# Altium footprint library AOO.PcbLib: 131 footprints (part 4 of 9)
Each footprint in its own frame and in the unit in brackets; x right, y up, seen from the top. Pads: shape width x height; smd on the part's side, far side on the other; paste and mask are expansions set on the pad; w line width, h text height; cw(c..) or ccw(c..) is an arc to the next point about the centre after c.
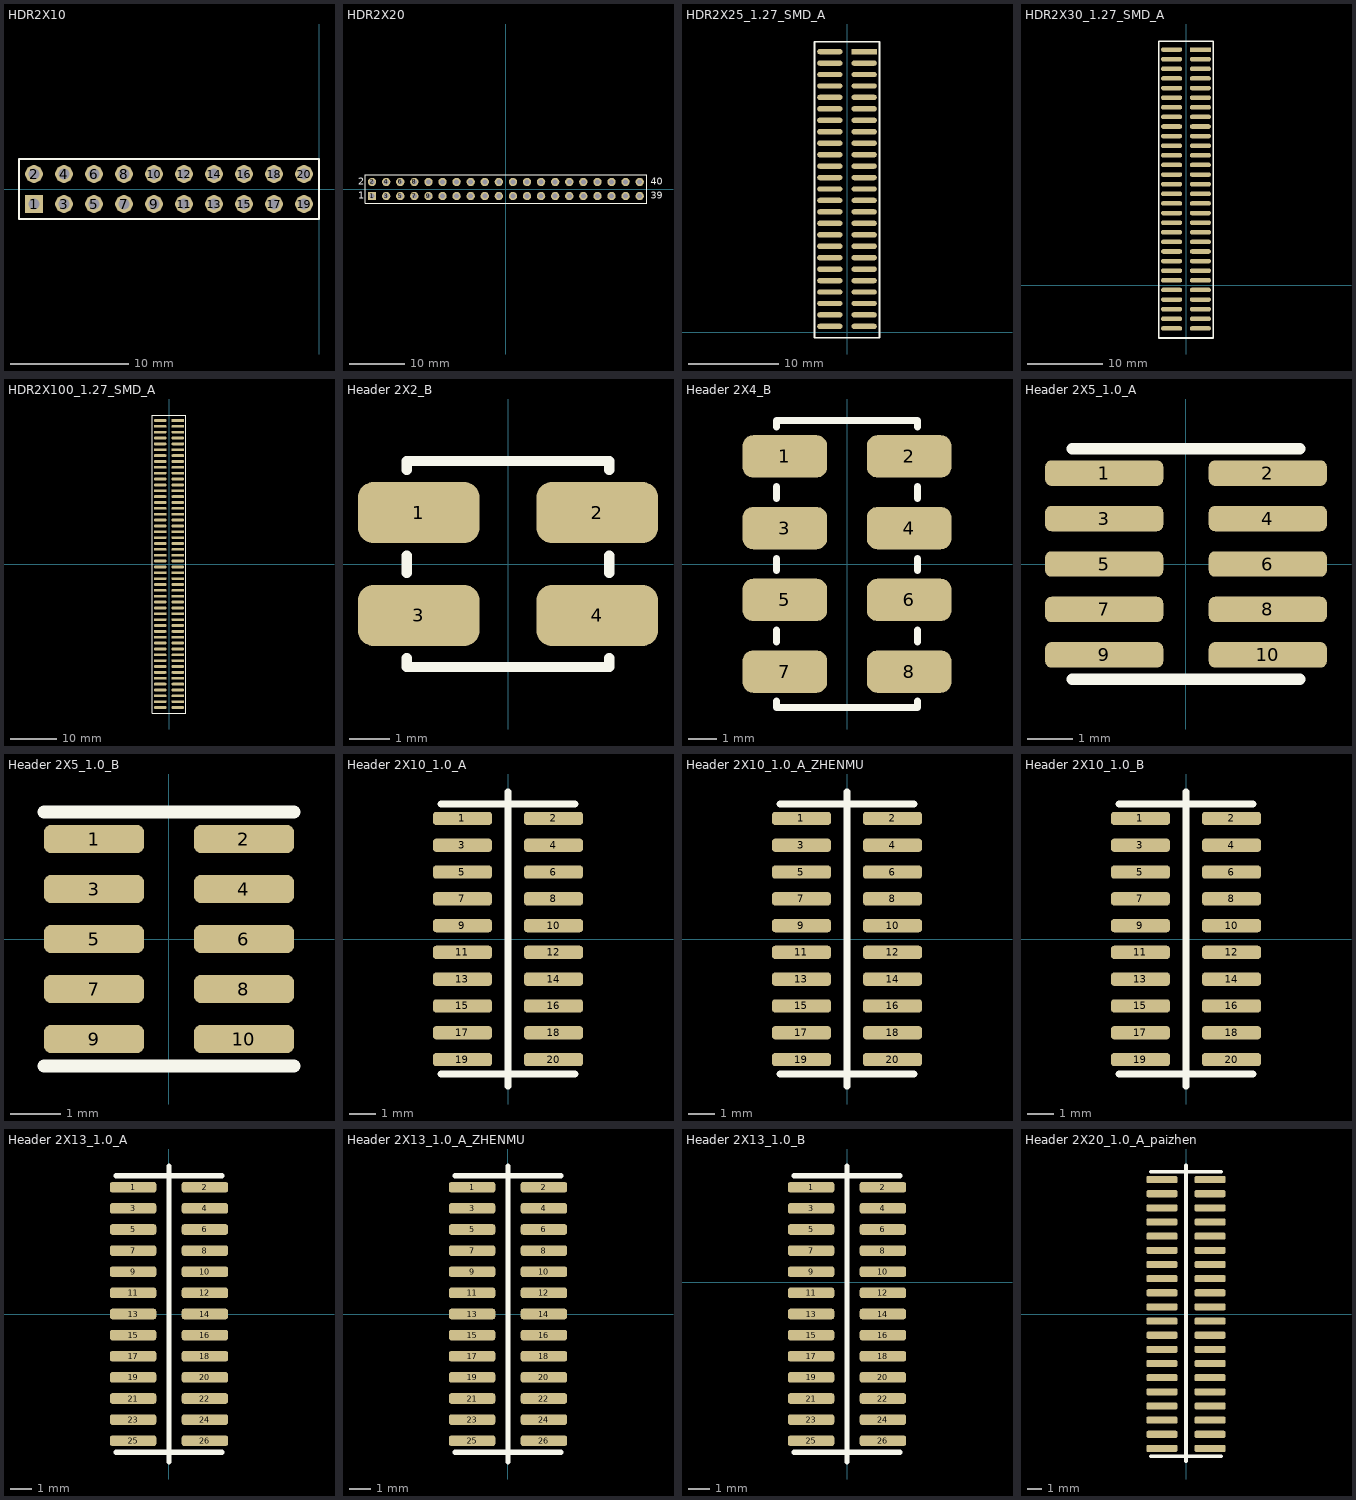
[diagram p3: the footprints below, top view; thin cyan lines are the x and y axes]

## HDR2X10 [mm] "HDR2X10"
pads (20):
  rect 1.5x1.5 hole 0.9: 1(-24.13,-1.27)
  round 1.5 hole 0.9: 2(-24.13,1.27) 3(-21.59,-1.27) 4(-21.59,1.27) 5(-19.05,-1.27) 6(-19.05,1.27) 7(-16.51,-1.27) 8(-16.51,1.27) 9(-13.97,-1.27) 10(-13.97,1.27) 11(-11.43,-1.27) 12(-11.43,1.27) 13(-8.89,-1.27) 14(-8.89,1.27) 15(-6.35,-1.27) 16(-6.35,1.27) 17(-3.81,-1.27) 18(-3.81,1.27) 19(-1.27,-1.27) 20(-1.27,1.27)
Top Overlay:
  lines w0.2: -25.4,-2.54 0,-2.54 0,2.54 -25.4,2.54 -25.4,-2.54

## HDR2X20 [mm] "Connector; Header; 20x2 Position"
pads (40):
  rect 1.5x1.5 hole 0.9: 1(-24.13,-1.27)
  round 1.5 hole 0.9: 2(-24.13,1.27) 3(-21.59,-1.27) 4(-21.59,1.27) 5(-19.05,-1.27) 6(-19.05,1.27) 7(-16.51,-1.27) 8(-16.51,1.27) 9(-13.97,-1.27) 10(-13.97,1.27) 11(-11.43,-1.27) 12(-11.43,1.27) 13(-8.89,-1.27) 14(-8.89,1.27) 15(-6.35,-1.27) 16(-6.35,1.27) 17(-3.81,-1.27) 18(-3.81,1.27) 19(-1.27,-1.27) 20(-1.27,1.27) 21(1.27,-1.27) 22(1.27,1.27) 23(3.81,-1.27) 24(3.81,1.27) 25(6.35,-1.27) 26(6.35,1.27) 27(8.89,-1.27) 28(8.89,1.27) 29(11.43,-1.27) 30(11.43,1.27) 31(13.97,-1.27) 32(13.97,1.27) 33(16.51,-1.27) 34(16.51,1.27) 35(19.05,-1.27) 36(19.05,1.27) 37(21.59,-1.27) 38(21.59,1.27) 39(24.13,-1.27) 40(24.13,1.27)
Top Overlay:
  lines w0.2: -25.4,-2.54 25.4,-2.54 25.4,2.54 -25.4,2.54 -25.4,-2.54
  text "1" at -26.67,-1.778 h1.27
  text "2" at -26.67,0.762 h1.27
  text "40" at 26.162,0.762 h1.27
  text "39" at 26.162,-1.778 h1.27

## HDR2X25_1.27_SMD_A [mm] "Connector; Header; 20x2 Position"
pads (50):
  rect 2.8x0.6 smd: 1(1.905,31.115)
  oval 2.8x0.6 smd: 2(-1.905,31.115) 3(1.905,29.845) 4(-1.905,29.845) 5(1.905,28.575) 6(-1.905,28.575) 7(1.905,27.305) 8(-1.905,27.305) 9(1.905,26.035) 10(-1.905,26.035) 11(1.905,24.765) 12(-1.905,24.765) 13(1.905,23.495) 14(-1.905,23.495) 15(1.905,22.225) 16(-1.905,22.225) 17(1.905,20.955) 18(-1.905,20.955) 19(1.905,19.685) 20(-1.905,19.685) 21(1.905,18.415) 22(-1.905,18.415) 23(1.905,17.145) 24(-1.905,17.145) 25(1.905,15.875) 26(-1.905,15.875) 27(1.905,14.605) 28(-1.905,14.605) 29(1.905,13.335) 30(-1.905,13.335) 31(1.905,12.065) 32(-1.905,12.065) 33(1.905,10.795) 34(-1.905,10.795) 35(1.905,9.525) 36(-1.905,9.525) 37(1.905,8.255) 38(-1.905,8.255) 39(1.905,6.985) 40(-1.905,6.985) 41(1.905,5.715) 42(-1.905,5.715) 43(1.905,4.445) 44(-1.905,4.445) 45(1.905,3.175) 46(-1.905,3.175) 47(1.905,1.905) 48(-1.905,1.905) 49(1.905,0.635) 50(-1.905,0.635)
Top Overlay:
  lines w0.2: -3.6,-0.635 -3.6,32.207 ; 3.6,-0.635 3.6,32.207
  lines w0.203: -3.6,-0.635 3.6,-0.635 ; -3.6,32.207 3.6,32.207

## HDR2X30_1.27_SMD_A [mm] "Connector; Header; 20x2 Position"
pads (60):
  rect 2.8x0.6 smd: 1(1.905,31.115)
  oval 2.8x0.6 smd: 2(-1.905,31.115) 3(1.905,29.845) 4(-1.905,29.845) 5(1.905,28.575) 6(-1.905,28.575) 7(1.905,27.305) 8(-1.905,27.305) 9(1.905,26.035) 10(-1.905,26.035) 11(1.905,24.765) 12(-1.905,24.765) 13(1.905,23.495) 14(-1.905,23.495) 15(1.905,22.225) 16(-1.905,22.225) 17(1.905,20.955) 18(-1.905,20.955) 19(1.905,19.685) 20(-1.905,19.685) 21(1.905,18.415) 22(-1.905,18.415) 23(1.905,17.145) 24(-1.905,17.145) 25(1.905,15.875) 26(-1.905,15.875) 27(1.905,14.605) 28(-1.905,14.605) 29(1.905,13.335) 30(-1.905,13.335) 31(1.905,12.065) 32(-1.905,12.065) 33(1.905,10.795) 34(-1.905,10.795) 35(1.905,9.525) 36(-1.905,9.525) 37(1.905,8.255) 38(-1.905,8.255) 39(1.905,6.985) 40(-1.905,6.985) 41(1.905,5.715) 42(-1.905,5.715) 43(1.905,4.445) 44(-1.905,4.445) 45(1.905,3.175) 46(-1.905,3.175) 47(1.905,1.905) 48(-1.905,1.905) 49(1.905,0.635) 50(-1.905,0.635) 51(1.905,-0.635) 52(-1.905,-0.635) 53(1.905,-1.905) 54(-1.905,-1.905) 55(1.905,-3.175) 56(-1.905,-3.175) 57(1.905,-4.445) 58(-1.905,-4.445) 59(1.905,-5.715) 60(-1.905,-5.715)
Top Overlay:
  lines w0.2: -3.6,-6.985 -3.6,32.207 ; 3.6,-6.985 3.6,32.207
  lines w0.203: -3.6,-6.985 3.6,-6.985 ; -3.6,32.207 3.6,32.207

## HDR2X100_1.27_SMD_A [mm] "Connector; Header; 20x2 Position"
pads (100):
  rect 2.8x0.6 smd: 1(1.905,31.115)
  oval 2.8x0.6 smd: 2(-1.905,31.115) 3(1.905,29.845) 4(-1.905,29.845) 5(1.905,28.575) 6(-1.905,28.575) 7(1.905,27.305) 8(-1.905,27.305) 9(1.905,26.035) 10(-1.905,26.035) 11(1.905,24.765) 12(-1.905,24.765) 13(1.905,23.495) 14(-1.905,23.495) 15(1.905,22.225) 16(-1.905,22.225) 17(1.905,20.955) 18(-1.905,20.955) 19(1.905,19.685) 20(-1.905,19.685) 21(1.905,18.415) 22(-1.905,18.415) 23(1.905,17.145) 24(-1.905,17.145) 25(1.905,15.875) 26(-1.905,15.875) 27(1.905,14.605) 28(-1.905,14.605) 29(1.905,13.335) 30(-1.905,13.335) 31(1.905,12.065) 32(-1.905,12.065) 33(1.905,10.795) 34(-1.905,10.795) 35(1.905,9.525) 36(-1.905,9.525) 37(1.905,8.255) 38(-1.905,8.255) 39(1.905,6.985) 40(-1.905,6.985) 41(1.905,5.715) 42(-1.905,5.715) 43(1.905,4.445) 44(-1.905,4.445) 45(1.905,3.175) 46(-1.905,3.175) 47(1.905,1.905) 48(-1.905,1.905) 49(1.905,0.635) 50(-1.905,0.635) 51(1.905,-0.635) 52(-1.905,-0.635) 53(1.905,-1.905) 54(-1.905,-1.905) 55(1.905,-3.175) 56(-1.905,-3.175) 57(1.905,-4.445) 58(-1.905,-4.445) 59(1.905,-5.715) 60(-1.905,-5.715) 61(1.905,-6.985) 62(-1.905,-6.985) 63(1.905,-8.255) 64(-1.905,-8.255) 65(1.905,-9.525) 66(-1.905,-9.525) 67(1.905,-10.795) 68(-1.905,-10.795) 69(1.905,-12.065) 70(-1.905,-12.065) 71(1.905,-13.335) 72(-1.905,-13.335) 73(1.905,-14.605) 74(-1.905,-14.605) 75(1.905,-15.875) 76(-1.905,-15.875) 77(1.905,-17.145) 78(-1.905,-17.145) 79(1.905,-18.415) 80(-1.905,-18.415) 81(1.905,-19.685) 82(-1.905,-19.685) 83(1.905,-20.955) 84(-1.905,-20.955) 85(1.905,-22.225) 86(-1.905,-22.225) 87(1.905,-23.495) 88(-1.905,-23.495) 89(1.905,-24.765) 90(-1.905,-24.765) 91(1.905,-26.035) 92(-1.905,-26.035) 93(1.905,-27.305) 94(-1.905,-27.305) 95(1.905,-28.575) 96(-1.905,-28.575) 97(1.905,-29.845) 98(-1.905,-29.845) 99(1.905,-31.115) 100(-1.905,-31.115)
Top Overlay:
  lines w0.2: -3.6,-32.385 -3.6,32.207 ; 3.6,-32.385 3.6,32.207
  lines w0.203: -3.6,-32.385 3.6,-32.385 ; -3.6,32.207 3.6,32.207
3D body: height 3.71, standoff 0.01, extent -2.65,-31.75 2.65,31.75

## Header 2X2_B [mm]
pads (4):
  rrect50% 3x1.5 smd: 1(-2.2,1.27) 2(2.2,1.27) 3(-2.2,-1.27) 4(2.2,-1.27)
Top Overlay:
  lines w0.254: -2.5,-2.32 -2.5,-2.54 2.5,-2.54 2.5,-2.32 ; -2.5,-0.22 -2.5,0.2 ; -2.5,2.32 -2.5,2.54 2.5,2.54 2.5,2.32 ; 2.5,-0.22 2.5,0.2
3D body: height 7.47, standoff 0.02, extent -3.3,-2.54 3.3,2.54

## Header 2X4_B [mm]
pads (8):
  rrect50% 3x1.5 smd: 1(-2.2,3.81) 2(2.2,3.81) 3(-2.2,1.27) 4(2.2,1.27) 5(-2.2,-1.27) 6(2.2,-1.27) 7(-2.2,-3.81) 8(2.2,-3.81)
Top Overlay:
  lines w0.254: -2.5,-4.86 -2.5,-5.08 2.5,-5.08 2.5,-4.86 ; -2.5,-2.76 -2.5,-2.34 ; -2.5,-0.22 -2.5,0.2 ; -2.5,2.32 -2.5,2.74 ; -2.5,4.86 -2.5,5.08 2.5,5.08 2.5,4.86 ; 2.5,-2.76 2.5,-2.34 ; 2.5,-0.22 2.5,0.2 ; 2.5,2.32 2.5,2.74
3D body: height 7.47, standoff 0.02, extent -3.3,-5.08 3.3,5.08

## Header 2X5_1.0_A [mm]
pads (10):
  rrect50% 2.6x0.56 smd: 1(-1.8,2) 2(1.8,2) 3(-1.8,1) 4(1.8,1) 5(-1.8,0) 6(1.8,0) 7(-1.8,-1) 8(1.8,-1) 9(-1.8,-2) 10(1.8,-2)
Top Overlay:
  lines w0.254: -2.5,-2.54 2.5,-2.54 ; -2.5,2.54 2.5,2.54
3D body: height 5.67, standoff 0.02, extent -2.6,-2.5 2.6,2.5

## Header 2X5_1.0_B [mm]
pads (10):
  rrect50% 2x0.56 smd: 1(-1.5,2) 2(1.5,2) 3(-1.5,1) 4(1.5,1) 5(-1.5,0) 6(1.5,0) 7(-1.5,-1) 8(1.5,-1) 9(-1.5,-2) 10(1.5,-2)
Top Overlay:
  lines w0.254: -2.5,-2.54 2.5,-2.54 ; -2.5,2.54 2.5,2.54
3D body: height 2.27, standoff 0.02, extent -2,-2.5 2,2.5

## Header 2X10_1.0_A [mm]
pads (20):
  rrect50% 2.2x0.5 smd: 1(-1.7,4.5) 2(1.7,4.5) 3(-1.7,3.5) 4(1.7,3.5) 5(-1.7,2.5) 6(1.7,2.5) 7(-1.7,1.5) 8(1.7,1.5) 9(-1.7,0.5) 10(1.7,0.5) 11(-1.7,-0.5) 12(1.7,-0.5) 13(-1.7,-1.5) 14(1.7,-1.5) 15(-1.7,-2.5) 16(1.7,-2.5) 17(-1.7,-3.5) 18(1.7,-3.5) 19(-1.7,-4.5) 20(1.7,-4.5)
Top Overlay:
  lines w0.254: -2.5,-5.04 2.5,-5.04 ; -2.5,5.04 2.5,5.04 ; 0,-5.5 0,5.5
3D body: height 3.67, standoff 0.02, extent -2.3,-5 2.3,5

## Header 2X10_1.0_A_ZHENMU [mm]
pads (20):
  rrect50% 2.2x0.5 smd: 1(-1.7,4.5) 2(1.7,4.5) 3(-1.7,3.5) 4(1.7,3.5) 5(-1.7,2.5) 6(1.7,2.5) 7(-1.7,1.5) 8(1.7,1.5) 9(-1.7,0.5) 10(1.7,0.5) 11(-1.7,-0.5) 12(1.7,-0.5) 13(-1.7,-1.5) 14(1.7,-1.5) 15(-1.7,-2.5) 16(1.7,-2.5) 17(-1.7,-3.5) 18(1.7,-3.5) 19(-1.7,-4.5) 20(1.7,-4.5)
Top Overlay:
  lines w0.254: -2.5,-5.04 2.5,-5.04 ; -2.5,5.04 2.5,5.04 ; 0,-5.5 0,5.5
3D body: height 3.92, standoff 0.02, extent -2.3,-5 2.3,5

## Header 2X10_1.0_B [mm]
pads (20):
  rrect50% 2.2x0.5 smd: 1(-1.7,4.5) 2(1.7,4.5) 3(-1.7,3.5) 4(1.7,3.5) 5(-1.7,2.5) 6(1.7,2.5) 7(-1.7,1.5) 8(1.7,1.5) 9(-1.7,0.5) 10(1.7,0.5) 11(-1.7,-0.5) 12(1.7,-0.5) 13(-1.7,-1.5) 14(1.7,-1.5) 15(-1.7,-2.5) 16(1.7,-2.5) 17(-1.7,-3.5) 18(1.7,-3.5) 19(-1.7,-4.5) 20(1.7,-4.5)
Top Overlay:
  lines w0.254: -2.5,-5.04 2.5,-5.04 ; -2.5,5.04 2.5,5.04 ; 0,-5.5 0,5.5
3D body: height 2.27, standoff 0.02, extent -2,-5 2,5

## Header 2X13_1.0_A [mm]
pads (26):
  rrect50% 2.2x0.5 smd: 1(-1.7,6) 2(1.7,6) 3(-1.7,5) 4(1.7,5) 5(-1.7,4) 6(1.7,4) 7(-1.7,3) 8(1.7,3) 9(-1.7,2) 10(1.7,2) 11(-1.7,1) 12(1.7,1) 13(-1.7,0) 14(1.7,0) 15(-1.7,-1) 16(1.7,-1) 17(-1.7,-2) 18(1.7,-2) 19(-1.7,-3) 20(1.7,-3) 21(-1.7,-4) 22(1.7,-4) 23(-1.7,-5) 24(1.7,-5) 25(-1.7,-6) 26(1.7,-6)
Top Overlay:
  lines w0.254: -2.5,-6.54 2.5,-6.54 ; -2.5,6.54 2.5,6.54 ; 0,-7 0,7
3D body: height 3.67, standoff 0.02, extent -2.3,-6.5 2.3,6.5

## Header 2X13_1.0_A_ZHENMU [mm]
pads (26):
  rrect50% 2.2x0.5 smd: 1(-1.7,6) 2(1.7,6) 3(-1.7,5) 4(1.7,5) 5(-1.7,4) 6(1.7,4) 7(-1.7,3) 8(1.7,3) 9(-1.7,2) 10(1.7,2) 11(-1.7,1) 12(1.7,1) 13(-1.7,0) 14(1.7,0) 15(-1.7,-1) 16(1.7,-1) 17(-1.7,-2) 18(1.7,-2) 19(-1.7,-3) 20(1.7,-3) 21(-1.7,-4) 22(1.7,-4) 23(-1.7,-5) 24(1.7,-5) 25(-1.7,-6) 26(1.7,-6)
Top Overlay:
  lines w0.254: -2.5,-6.54 2.5,-6.54 ; -2.5,6.54 2.5,6.54 ; 0,-7 0,7
3D body: height 3.92, standoff 0.02, extent -2.3,-6.5 2.3,6.5

## Header 2X13_1.0_B [mm]
pads (26):
  rrect50% 2.2x0.5 smd: 1(-1.7,4.5) 2(1.7,4.5) 3(-1.7,3.5) 4(1.7,3.5) 5(-1.7,2.5) 6(1.7,2.5) 7(-1.7,1.5) 8(1.7,1.5) 9(-1.7,0.5) 10(1.7,0.5) 11(-1.7,-0.5) 12(1.7,-0.5) 13(-1.7,-1.5) 14(1.7,-1.5) 15(-1.7,-2.5) 16(1.7,-2.5) 17(-1.7,-3.5) 18(1.7,-3.5) 19(-1.7,-4.5) 20(1.7,-4.5) 21(-1.7,-5.5) 22(1.7,-5.5) 23(-1.7,-6.5) 24(1.7,-6.5) 25(-1.7,-7.5) 26(1.7,-7.5)
Top Overlay:
  lines w0.254: -2.5,-8.04 2.5,-8.04 ; -2.5,5.04 2.5,5.04 ; 0,-8.5 0,5.5
3D body: height 2.27, standoff 0.02, extent -2,-8 2,5

## Header 2X20_1.0_A_paizhen [mm]
pads (40):
  rrect50% 2.2x0.5 smd: 1(-1.7,9.5) 2(1.7,9.5) 3(-1.7,8.5) 4(1.7,8.5) 5(-1.7,7.5) 6(1.7,7.5) 7(-1.7,6.5) 8(1.7,6.5) 9(-1.7,5.5) 10(1.7,5.5) 11(-1.7,4.5) 12(1.7,4.5) 13(-1.7,3.5) 14(1.7,3.5) 15(-1.7,2.5) 16(1.7,2.5) 17(-1.7,1.5) 18(1.7,1.5) 19(-1.7,0.5) 20(1.7,0.5) 21(-1.7,-0.5) 22(1.7,-0.5) 23(-1.7,-1.5) 24(1.7,-1.5) 25(-1.7,-2.5) 26(1.7,-2.5) 27(-1.7,-3.5) 28(1.7,-3.5) 29(-1.7,-4.5) 30(1.7,-4.5) 31(-1.7,-5.5) 32(1.7,-5.5) 33(-1.7,-6.5) 34(1.7,-6.5) 35(-1.7,-7.5) 36(1.7,-7.5) 37(-1.7,-8.5) 38(1.7,-8.5) 39(-1.7,-9.5) 40(1.7,-9.5)
Top Overlay:
  lines w0.254: -2.5,-10.04 2.5,-10.04 ; -2.5,10.04 2.5,10.04 ; 0,-10.4 0,10.5